# Altium footprint library self_pcblib v1.8.6.PcbLib: 123 footprints (part 5 of 8)
Each footprint in its own frame and in the unit in brackets; x right, y up, seen from the top. Pads: shape width x height; smd on the part's side, far side on the other; paste and mask are expansions set on the pad; w line width, h text height; cw(c..) or ccw(c..) is an arc to the next point about the centre after c.
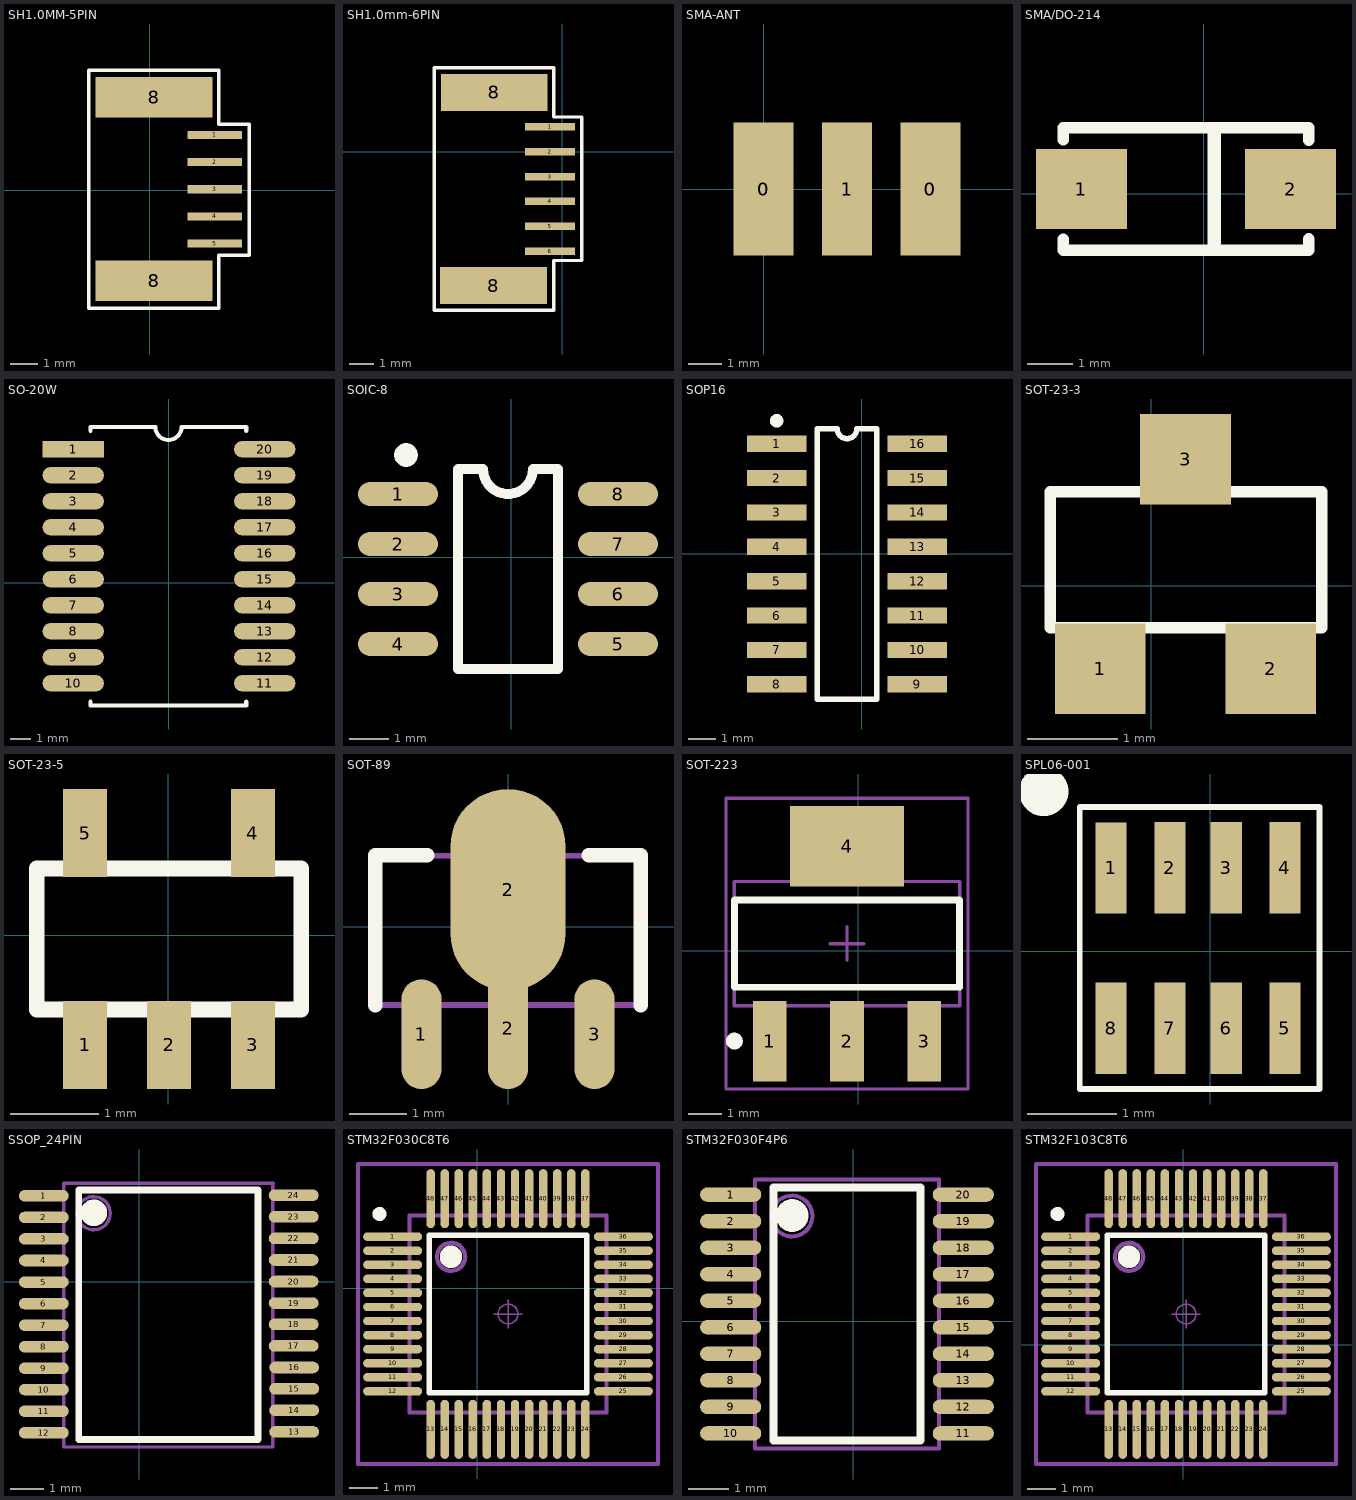
[diagram p4: the footprints below, top view; thin cyan lines are the x and y axes]

## SH1.0MM-5PIN [mm]
pads (7):
  rect 2x0.3 smd: 1(2.396,2.041) 2(2.396,1.041) 3(2.396,0.041) 4(2.396,-0.959) 5(2.396,-1.959)
  rect 4.3x1.5 smd: 8(0.152,-3.327) 8(0.152,3.429)
Top Overlay:
  lines w0.127: -2.261,-4.343 2.546,-4.343 2.546,-2.388 3.671,-2.388 3.671,2.441 2.546,2.441 2.546,4.42 -2.261,4.42 -2.261,-4.343

## SH1.0mm-6PIN [mm]
pads (8):
  rect 2x0.3 smd: 1(-0.5,1) 2(-0.5,0) 3(-0.5,-1) 4(-0.5,-2) 5(-0.5,-3) 6(-0.5,-4)
  rect 4.3x1.5 smd: 8(-2.769,-5.385) 8(-2.743,2.388)
Top Overlay:
  lines w0.127: -5.156,-6.375 -5.156,3.378 -0.35,3.378 -0.35,1.4 0.775,1.4 0.775,-4.375 -0.35,-4.375 -0.35,-6.375 -5.156,-6.375
3D body "User Library-JST - SM06B-SRSS-TB (SH SERIES - 1_0mm PITCH WIRE-TO-BOARD, SMT, RA).STEP": height 4.25, standoff -0.7, extent -4.95,-5.5 -2.05,2.5

## SMA-ANT [mm]
pads (5):
  rect 1.8x4 smd: 0(0,0) 0(0,0) 0(5,0) 0(5,0)
  rect 1.5x4 smd: 1(2.5,0)
3D body "User Library-620-SMA-02-112-TGG SMA Female for PCB edge Mount.STEP": height 8.11, standoff 2.06, extent -0.5,-1.8 5.5,11.8
3D body "User Library-SMA Antenna.STEP": height 87, standoff 0, extent -2.5,6.5 7.5,37.4

## SMA/DO-214 [mm]
pads (2):
  rect 2x1.75 smd: 1(-2.692,0.102) 2(1.908,0.102)
Top Overlay:
  lines w0.254: -3.092,-1.003 -3.092,-1.248 2.308,-1.248 2.308,-0.998 ; -3.092,1.182 -3.092,1.452 2.303,1.452 ; 2.308,1.177 2.308,1.452
  lines w0.3: 0.228,-1.198 0.228,1.402
3D body "DO-214AC.STEP": height 2.4, standoff 0, extent -2.695,-1.27 1.905,1.43

## SO-20W [mm]
pads (20):
  rect 3x0.8 smd: 1(-4.652,6.52)
  oval 3x0.8 smd: 2(-4.652,5.25) 3(-4.652,3.98) 4(-4.652,2.71) 5(-4.652,1.44) 6(-4.652,0.17) 7(-4.652,-1.1) 8(-4.652,-2.37) 9(-4.652,-3.64) 10(-4.652,-4.91) 11(4.7,-4.91) 12(4.7,-3.64) 13(4.7,-2.37) 14(4.7,-1.1) 15(4.7,0.17) 16(4.7,1.44) 17(4.7,2.71) 18(4.7,3.98) 19(4.7,5.25) 20(4.7,6.52)
Top Overlay:
  lines w0.2: -3.802,-5.81 -3.802,-5.995 3.798,-5.995 3.798,-5.81 ; -3.802,7.42 -3.802,7.605 -0.637,7.605 ccw(c-0.002,7.605) 0.633,7.605 3.798,7.605 3.798,7.42
3D body "User Library-SO-20W.STEP": height 2.48, standoff 0, extent -5.155,-5.61 5.155,7.21

## SOIC-8 [mil]
pads (8):
  oval 80x24 smd: 1(-113,63) 2(-113,13) 3(-113,-37) 4(-113,-87) 5(107,-87) 6(107,-37) 7(107,13) 8(107,63)
Top Overlay:
  circle w11.81: c-105,102 r5.91
  lines w10: -53,-112 -53,88 -28,88 ccw(c-3,88) 22,88 47,88 47,-112 -53,-112
3D body "User Library-so-8.step": height 73.87, standoff -1.02, extent -127.77,-110.25 121.78,86.75

## SOP16 [mm]
pads (16):
  rect 2.2x0.6 smd: 1(-3.146,4.064) 2(-3.146,2.794) 3(-3.146,1.524) 4(-3.146,0.254) 5(-3.146,-1.016) 6(-3.146,-2.286) 7(-3.146,-3.556) 8(-3.146,-4.826) 9(2.054,-4.826) 10(2.054,-3.556) 11(2.054,-2.286) 12(2.054,-1.016) 13(2.054,0.254) 14(2.054,1.524) 15(2.054,2.794) 16(2.054,4.064)
Top Overlay:
  circle w0.25: c-3.146,4.914 r0.125
  lines w0.2: -1.646,-5.381 -1.646,4.619 -0.912,4.619 ccw(c-0.546,4.619) -0.179,4.619 0.554,4.619 0.554,-5.381 -1.646,-5.381
3D body "User Library-SOP16_208mil (5_3mm).STEP": height 1.8, standoff -0.2, extent -4.519,-5.436 3.402,4.764

## SOT-23-3 [mm]
pads (3):
  rect 1x1 smd: 1(-0.559,-0.914) 2(1.321,-0.914) 3(0.381,1.397)
Top Overlay:
  lines w0.127: -1.114,-0.462 -1.114,1.038 1.886,1.038 1.886,-0.462 -1.114,-0.462
3D body "SOT-23-3.STEP": height 1.2, standoff 0, extent -1.122,-1.146 1.778,1.654

## SOT-23-5 [mm]
pads (5):
  rect 0.5x1 smd: 1(-0.94,-1.245) 2(0.01,-1.245) 3(0.96,-1.245) 4(0.96,1.155) 5(-0.94,1.155)
Top Overlay:
  lines w0.178: -1.49,-0.845 -1.49,0.755 1.51,0.755 1.51,-0.845 -1.49,-0.845
3D body "User Library-SOT23-5.STEP": height 1.09, standoff -0.01, extent -1.44,-1.446 1.46,1.355

## SOT-89 [mm]
pads (4):
  oval 0.7x1.9 smd: 1(-1.5,-1.865) 3(1.5,-1.865)
  oval 0.7x2.1 smd: 2(0,-1.765)
  oval 2x3.5 smd: 2(0,0.635)
Top Overlay:
  lines w0.254: -2.3,-1.365 -2.3,1.235 -1.4,1.235 ; 1.4,1.235 2.3,1.235 2.3,-1.365
Mechanical 13:
  lines w0.1: -2.3,-1.36 2.3,-1.36 2.3,1.23 -2.3,1.23 -2.3,-1.36
3D body "SOT-89-3.STEP": height 1.51, standoff 0, extent -2.25,-2.415 2.25,1.885

## SOT-223 [mm]
pads (4):
  rect 1x2.4 smd: 1(-2.635,-2.692) 2(-0.335,-2.692) 3(1.965,-2.692)
  rect 3.4x2.4 smd: 4(-0.335,3.108)
Top Overlay:
  circle w0.25: c-3.685,-2.692 r0.125
  lines w0.2: -3.685,-1.092 3.015,-1.092 3.015,1.508 -3.685,1.508 -3.685,-1.092
Mechanical 13:
  lines w0.1: -3.685,-1.642 3.015,-1.642 3.015,2.058 -3.685,2.058 -3.685,-1.642
Mechanical 15:
  lines w0.1: -0.835,0.208 0.165,0.208 ; -0.335,-0.292 -0.335,0.708 ; -3.935,-4.117 3.265,-4.117 3.265,4.533 -3.935,4.533 -3.935,-4.117
3D body "SOT-223-3.step": height 1.65, standoff -0.03, extent -3.635,-3.551 2.865,3.409

## SPL06-001 [mil] "气压计"
pads (8):
  rect 13.78x40.4 smd: 1(-44,37)
  rect 13.78x40.59 smd: 2(-18,37) 5(33,-34) 6(7,-34) 7(-18,-34) 8(-44,-34)
  rect 13.78x40.5 smd: 3(7,37) 4(33,37)
Top Overlay:
  circle w20: c-73.98,71 r0.98
  lines w2.5: -57.94,-61 -57.94,64 48.35,64 48.35,-45.61 48.35,-61 -57.94,-61
3D body: height 25.9, standoff 0, extent -52,-39.5 44,42.5

## SSOP_24PIN [mm]
pads (24):
  oval 1.5x0.35 smd: 1(-2.875,2.595) 2(-2.875,1.945) 3(-2.875,1.295) 4(-2.875,0.645) 5(-2.875,-0.005) 6(-2.875,-0.655) 7(-2.875,-1.305) 8(-2.875,-1.955) 9(-2.875,-2.605) 10(-2.875,-3.247) 11(-2.875,-3.897) 12(-2.875,-4.547) 13(4.668,-4.522) 14(4.668,-3.872) 15(4.668,-3.222) 16(4.668,-2.58) 17(4.653,-1.931) 18(4.653,-1.281) 19(4.653,-0.639) 20(4.653,0.011) 21(4.653,0.661) 22(4.653,1.311) 23(4.653,1.961) 24(4.653,2.611)
Top Overlay:
  circle w0.4: c-1.368,2.083 r0.2
  lines w0.2: 3.556,2.77 -1.825,2.77 -1.825,-4.75 3.581,-4.75 ; 3.578,-4.75 3.578,2.77
Mechanical 13:
  circle w0.1: c-1.375,2.07 r0.5
  lines w0.1: 4.013,-4.978 -2.275,-4.978 -2.275,2.97 4.039,2.97 ; 4.028,-4.978 4.028,2.97
3D body "User Library-SSOP 24 PIN_.STEP": height 1.78, standoff -0.21, extent -3.036,-5.309 4.864,3.321

## STM32F030C8T6 [mm]
pads (48):
  oval 2.1x0.3 smd: 1(-3.008,1.836) 2(-3.008,1.336) 3(-3.008,0.836) 4(-3.008,0.336) 5(-3.008,-0.164) 6(-3.008,-0.664) 7(-3.008,-1.164) 8(-3.008,-1.664) 9(-3.008,-2.164) 10(-3.008,-2.664) 11(-3.008,-3.164) 12(-3.008,-3.664) 25(5.192,-3.664) 26(5.192,-3.164) 27(5.192,-2.664) 28(5.192,-2.164) 29(5.192,-1.664) 30(5.192,-1.164) 31(5.192,-0.664) 32(5.192,-0.164) 33(5.192,0.336) 34(5.192,0.836) 35(5.192,1.336) 36(5.192,1.836)
  oval 0.3x2.1 smd: 13(-1.658,-5.014) 14(-1.158,-5.014) 15(-0.658,-5.014) 16(-0.158,-5.014) 17(0.342,-5.014) 18(0.842,-5.014) 19(1.342,-5.014) 20(1.842,-5.014) 21(2.342,-5.014) 22(2.842,-5.014) 23(3.342,-5.014) 24(3.842,-5.014) 37(3.842,3.186) 38(3.342,3.186) 39(2.842,3.186) 40(2.342,3.186) 41(1.842,3.186) 42(1.342,3.186) 43(0.842,3.186) 44(0.342,3.186) 45(-0.158,3.186) 46(-0.658,3.186) 47(-1.158,3.186) 48(-1.658,3.186)
Top Overlay:
  circle w0.6: c-0.935,1.118 r0.1
  circle w0.25: c-3.48,2.642 r0.125
  lines w0.2: -1.702,-3.708 3.886,-3.708 3.886,1.88 -1.702,1.88 -1.702,-3.708
Mechanical 13:
  circle w0.15: c-0.932,1.118 r0.5
  lines w0.15: -2.408,-4.414 4.592,-4.414 4.592,2.586 -2.408,2.586 -2.408,-4.414
Mechanical 15:
  circle w0.05: c1.092,-0.914 r0.35
  lines w0.05: 0.592,-0.914 1.592,-0.914 ; 1.092,-1.414 1.092,-0.414
  lines w0.15: -4.242,-6.248 6.426,-6.248 6.426,4.42 -4.242,4.42 -4.242,-6.248
3D body "LQFP48-7x7.STEP": height 1.45, standoff 0, extent -3.408,-5.414 5.592,3.586

## STM32F030F4P6 [mm]
pads (20):
  oval 1.5x0.35 smd: 1(-3.002,3.103) 2(-3.002,2.453) 3(-3.002,1.803) 4(-3.002,1.153) 5(-3.002,0.503) 6(-3.002,-0.147) 7(-3.002,-0.797) 8(-3.002,-1.447) 9(-3.002,-2.097) 10(-3.002,-2.747) 11(2.698,-2.747) 12(2.698,-2.097) 13(2.698,-1.447) 14(2.698,-0.797) 15(2.698,-0.147) 16(2.698,0.503) 17(2.698,1.153) 18(2.698,1.803) 19(2.698,2.453) 20(2.698,3.103)
Top Overlay:
  circle w0.4: c-1.495,2.591 r0.2
  lines w0.2: -1.952,-2.922 1.648,-2.922 1.648,3.278 -1.952,3.278 -1.952,-2.922
Mechanical 13:
  circle w0.1: c-1.502,2.578 r0.5
  lines w0.1: -2.402,-3.122 2.098,-3.122 2.098,3.478 -2.402,3.478 -2.402,-3.122
3D body "User Library-tssop-20-1.STEP": height 1.2, standoff 0, extent -3.452,-3.124 3.148,3.476

## STM32F103C8T6 [mm]
pads (48):
  oval 2.1x0.3 smd: 1(-4.008,3.836) 2(-4.008,3.336) 3(-4.008,2.836) 4(-4.008,2.336) 5(-4.008,1.836) 6(-4.008,1.336) 7(-4.008,0.836) 8(-4.008,0.336) 9(-4.008,-0.164) 10(-4.008,-0.664) 11(-4.008,-1.164) 12(-4.008,-1.664) 25(4.192,-1.664) 26(4.192,-1.164) 27(4.192,-0.664) 28(4.192,-0.164) 29(4.192,0.336) 30(4.192,0.836) 31(4.192,1.336) 32(4.192,1.836) 33(4.192,2.336) 34(4.192,2.836) 35(4.192,3.336) 36(4.192,3.836)
  oval 0.3x2.1 smd: 13(-2.658,-3.014) 14(-2.158,-3.014) 15(-1.658,-3.014) 16(-1.158,-3.014) 17(-0.658,-3.014) 18(-0.158,-3.014) 19(0.342,-3.014) 20(0.842,-3.014) 21(1.342,-3.014) 22(1.842,-3.014) 23(2.342,-3.014) 24(2.842,-3.014) 37(2.842,5.186) 38(2.342,5.186) 39(1.842,5.186) 40(1.342,5.186) 41(0.842,5.186) 42(0.342,5.186) 43(-0.158,5.186) 44(-0.658,5.186) 45(-1.158,5.186) 46(-1.658,5.186) 47(-2.158,5.186) 48(-2.658,5.186)
Top Overlay:
  circle w0.6: c-1.935,3.118 r0.1
  circle w0.25: c-4.48,4.642 r0.125
  lines w0.2: -2.702,-1.708 2.886,-1.708 2.886,3.88 -2.702,3.88 -2.702,-1.708
Mechanical 13:
  circle w0.15: c-1.932,3.118 r0.5
  lines w0.15: -3.408,-2.414 3.592,-2.414 3.592,4.586 -3.408,4.586 -3.408,-2.414
Mechanical 15:
  circle w0.05: c0.092,1.086 r0.35
  lines w0.05: -0.408,1.086 0.592,1.086 ; 0.092,0.586 0.092,1.586
  lines w0.15: -5.242,-4.248 5.426,-4.248 5.426,6.42 -5.242,6.42 -5.242,-4.248
3D body "LQFP48-7x7.STEP": height 1.45, standoff 0, extent -4.408,-3.414 4.592,5.586